# Altium schematic symbol library Capacitor - Ceramic - Sumsung.SchLib: 1421 symbols (part 6 of 8) (continued)
## CL31B105KBHNFNE (continued)
CAP CER 1UF 50V X7R 1206; Part Number: CL31B105KBHNFNE; Manufacturer: Samsung Electro-Mechanics America, Inc.; TemperatureRange: -55C ~ 125C; Tolerance: 10%; Value: 1uF; PartId: 17699; Supplier 1: Digi-Key; Supplier Part Number 1: 1276-3091-2-ND; ComponentLink1Description: Datasheet; ComponentLink1URL: http://www.samsungsem.com/kr/support/product-search/mlcc/__icsFiles/afieldfile/2016/08/18/S_CL31B105KBHNFNE.pdf; ComponentLink2Description: Digi-Key Listing; ComponentLink2URL: https://www.digikey.com/product-detail/en/samsung-electro-mechanics-america-inc/CL31B105KBHNFNE/1276-3091-2-ND/3888749; TemperatureCoefficient: X7R; Voltage: 50V; Price: 0.0513; Device Package: 1206 (3216 Metric)
footprint CAP 1206/3216 - 1.8MM
pins: 1, 2

## CL31B105KBHNNNE
designator C?, comment 1uF
CAP CER 1UF 50V X7R 1206; Part Number: CL31B105KBHNNNE; Manufacturer: Samsung Electro-Mechanics America, Inc.; TemperatureRange: -55C ~ 125C; Tolerance: 10%; Value: 1uF; PartId: 6164; Supplier 1: Digi-Key; Supplier Part Number 1: 1276-1068-2-ND; ComponentLink1Description: Datasheet; ComponentLink1URL: http://www.samsungsem.com/kr/support/product-search/mlcc/CL31B105KBHNNNE.jsp; ComponentLink2Description: Digi-Key listing; ComponentLink2URL: http://digikey.com/product-detail/en/CL31B105KBHNNNE/1276-1068-2-ND/3886726; TemperatureCoefficient: X7R; Voltage: 50V; Price: 0.0489; Type: -; Device Package: 1206 (3216 Metric)
footprint CAP 1206/3216
pins: 1, 2

## CL31B105KBHWPNE
designator C?, comment 1uF
CAP CER 1UF 50V X7R 1206; Part Number: CL31B105KBHWPNE; Manufacturer: Samsung Electro-Mechanics America, Inc.; TemperatureRange: -55C ~ 125C; Tolerance: 10%; Value: 1uF; PartId: 17749; Supplier 1: Digi-Key; Supplier Part Number 1: 1276-6737-2-ND; ComponentLink1Description: Datasheet; ComponentLink1URL: //media.digikey.com/pdf/Data%20Sheets/Samsung%20PDFs/MLCC_Catalog_2015.pdf; ComponentLink2Description: Digi-Key Listing; ComponentLink2URL: https://www.digikey.com/product-detail/en/samsung-electro-mechanics-america-inc/CL31B105KBHWPNE/1276-6737-2-ND/5961221; TemperatureCoefficient: X7R; Voltage: 50V; Price: 0.1068; Device Package: 1206 (3216 Metric)
footprint CAP 1206/3216 - 1.8MM
pins: 1, 2

## CL31B105KCHNFNE
designator C?, comment 1uF
CAP CER 1UF 100V X7R 1206; Part Number: CL31B105KCHNFNE; Manufacturer: Samsung Electro-Mechanics America, Inc.; TemperatureRange: -55C ~ 125C; Tolerance: 10%; Value: 1uF; PartId: 17949; Supplier 1: Digi-Key; Supplier Part Number 1: 1276-3094-2-ND; ComponentLink1Description: Datasheet; ComponentLink1URL: //media.digikey.com/pdf/Data%20Sheets/Samsung%20PDFs/CL31B105KCHNFNE_Spec.pdf; ComponentLink2Description: Digi-Key Listing; ComponentLink2URL: https://www.digikey.com/product-detail/en/samsung-electro-mechanics-america-inc/CL31B105KCHNFNE/1276-3094-2-ND/3888752; TemperatureCoefficient: X7R; Voltage: 100V; Price: 0.1218; Device Package: 1206 (3216 Metric)
footprint CAP 1206/3216 - 1.8MM
pins: 1, 2

## CL31B105KCHNNNE
designator C?, comment 1uF
CAP CER 1UF 100V X7R 1206; Part Number: CL31B105KCHNNNE; Manufacturer: Samsung Electro-Mechanics America, Inc.; TemperatureRange: -55C ~ 125C; Tolerance: 10%; Value: 1uF; PartId: 6198; Supplier 1: Digi-Key; Supplier Part Number 1: 1276-1838-2-ND; ComponentLink1Description: Datasheet; ComponentLink1URL: http://www.samsungsem.com/kr/support/product-search/mlcc/CL31B105KCHNNNE.jsp; ComponentLink2Description: Digi-Key listing; ComponentLink2URL: http://digikey.com/product-detail/en/CL31B105KCHNNNE/1276-1838-2-ND/3887496; TemperatureCoefficient: X7R; Voltage: 100V; Price: 0.1037; Type: -; Device Package: 1206 (3216 Metric)
footprint CAP 1206/3216
pins: 1, 2

## CL31B105KCHSNNE
designator C?, comment 1uF
CAP CER 1UF 100V X7R 1206; Part Number: CL31B105KCHSNNE; Manufacturer: Samsung Electro-Mechanics America, Inc.; TemperatureRange: -55C ~ 125C; Tolerance: 10%; Value: 1uF; PartId: 17470; Supplier 1: Digi-Key; Supplier Part Number 1: 1276-2747-2-ND; ComponentLink1Description: Datasheet; ComponentLink1URL: //media.digikey.com/pdf/Data%20Sheets/Samsung%20PDFs/CL31B105KCHSNNE_Spec.pdf; ComponentLink2Description: Digi-Key Listing; ComponentLink2URL: https://www.digikey.com/product-detail/en/samsung-electro-mechanics-america-inc/CL31B105KCHSNNE/1276-2747-2-ND/3888405; TemperatureCoefficient: X7R; Voltage: 100V; Price: 0.1218; Device Package: 1206 (3216 Metric)
footprint CAP 1206/3216 - 1.8MM
pins: 1, 2

## CL31B105KOFNNNE
designator C?, comment 1uF
CAP CER 1UF 16V X7R 1206; Part Number: CL31B105KOFNNNE; Manufacturer: Samsung Electro-Mechanics America, Inc.; TemperatureRange: -55C ~ 125C; Tolerance: 10%; Value: 1uF; PartId: 6162; Supplier 1: Digi-Key; Supplier Part Number 1: 1276-1783-2-ND; ComponentLink1Description: Datasheet; ComponentLink1URL: http://www.samsungsem.com/kr/support/product-search/mlcc/CL31B105KOFNNNE.jsp; ComponentLink2Description: Digi-Key listing; ComponentLink2URL: http://digikey.com/product-detail/en/CL31B105KOFNNNE/1276-1783-2-ND/3887441; TemperatureCoefficient: X7R; Voltage: 16V; Price: 0.038; Type: -; Device Package: 1206 (3216 Metric)
footprint CAP 1206/3216
pins: 1, 2

## CL31B105MAHNNNE
designator C?, comment 1uF
CAP CER 1UF 25V X7R 1206; Part Number: CL31B105MAHNNNE; Manufacturer: Samsung Electro-Mechanics America, Inc.; TemperatureRange: -55C ~ 125C; Tolerance: 20%; Value: 1uF; PartId: 17578; Supplier 1: Digi-Key; Supplier Part Number 1: 1276-3098-2-ND; ComponentLink1Description: Datasheet; ComponentLink1URL: http://www.samsungsem.com/kr/support/product-search/mlcc/__icsFiles/afieldfile/2016/08/18/S_CL31B105MAHNNNE.pdf; ComponentLink2Description: Digi-Key Listing; ComponentLink2URL: https://www.digikey.com/product-detail/en/samsung-electro-mechanics-america-inc/CL31B105MAHNNNE/1276-3098-2-ND/3888756; TemperatureCoefficient: X7R; Voltage: 25V; Price: 0.0396; Device Package: 1206 (3216 Metric)
footprint CAP 1206/3216 - 1.8MM
pins: 1, 2

## CL31B106KAHNFNE
designator C?, comment 10uF
CAP CER 10UF 25V X7R 1206; Part Number: CL31B106KAHNFNE; Manufacturer: Samsung Electro-Mechanics America, Inc.; TemperatureRange: -55C ~ 125C; Tolerance: 10%; Value: 10uF; PartId: 15883; Supplier 1: Digi-Key; Supplier Part Number 1: 1276-3100-2-ND; ComponentLink1Description: Datasheet; ComponentLink1URL: http://www.samsungsem.com/kr/support/product-search/mlcc/CL31B106KAHNFNE.jsp; ComponentLink2Description: Digi-Key Listing; ComponentLink2URL: https://www.digikey.com/product-detail/en/samsung-electro-mechanics-america-inc/CL31B106KAHNFNE/1276-3100-2-ND/3888758; TemperatureCoefficient: X7R; Voltage: 25V; Price: 0.0976; Device Package: 1206 (3216 Metric)
footprint CAP 1206/3216
pins: 1, 2

## CL31B106KAHNNNE
designator C?, comment 10uF
CAP CER 10UF 25V X7R 1206; Part Number: CL31B106KAHNNNE; Manufacturer: Samsung Electro-Mechanics America, Inc.; TemperatureRange: -55C ~ 125C; Tolerance: 10%; Value: 10uF; PartId: 15760; Supplier 1: Digi-Key; Supplier Part Number 1: 1276-1804-2-ND; ComponentLink1Description: Datasheet; ComponentLink1URL: http://www.samsungsem.com/kr/support/product-search/mlcc/CL31B106KAHNNNE.jsp; ComponentLink2Description: Digi-Key Listing; ComponentLink2URL: https://www.digikey.com/product-detail/en/samsung-electro-mechanics-america-inc/CL31B106KAHNNNE/1276-1804-2-ND/3887462; TemperatureCoefficient: X7R; Voltage: 25V; Price: 0.0976; Device Package: 1206 (3216 Metric)
footprint CAP 1206/3216
pins: 1, 2

## CL31B106KAHSFNE
designator C?, comment 10uF
CAP CER 10UF 25V X7R 1206; Part Number: CL31B106KAHSFNE; Manufacturer: Samsung Electro-Mechanics America, Inc.; TemperatureRange: -55C ~ 125C; Tolerance: 10%; Value: 10uF; PartId: 17742; Supplier 1: Digi-Key; Supplier Part Number 1: 1276-3101-2-ND; ComponentLink1Description: Datasheet; ComponentLink1URL: http://www.samsungsem.com/kr/support/product-search/mlcc/__icsFiles/afieldfile/2016/08/18/S_CL31B106KAHSFNE.pdf; ComponentLink2Description: Digi-Key Listing; ComponentLink2URL: https://www.digikey.com/product-detail/en/samsung-electro-mechanics-america-inc/CL31B106KAHSFNE/1276-3101-2-ND/3888759; TemperatureCoefficient: X7R; Voltage: 25V; Price: 0.1205; Device Package: 1206 (3216 Metric)
footprint CAP 1206/3216 - 1.8MM
pins: 1, 2

## CL31B106KLHNFNE
designator C?, comment 10uF
CAP CER 10UF 35V X7R 1206; Part Number: CL31B106KLHNFNE; Manufacturer: Samsung Electro-Mechanics America, Inc.; TemperatureRange: -55C ~ 125C; Tolerance: 10%; Value: 10uF; PartId: 16006; Supplier 1: Digi-Key; Supplier Part Number 1: 1276-3102-2-ND; ComponentLink1Description: Datasheet; ComponentLink1URL: http://www.samsungsem.com/kr/support/product-search/mlcc/CL31B106KLHNFNE.jsp; ComponentLink2Description: Digi-Key Listing; ComponentLink2URL: https://www.digikey.com/product-detail/en/samsung-electro-mechanics-america-inc/CL31B106KLHNFNE/1276-3102-2-ND/3888760; TemperatureCoefficient: X7R; Voltage: 35V; Price: 0.3179; Device Package: 1206 (3216 Metric)
footprint CAP 1206/3216
pins: 1, 2

## CL31B106KLHNNNE
designator C?, comment 10uF
CAP CER 10UF 35V X7R 1206; Part Number: CL31B106KLHNNNE; Manufacturer: Samsung Electro-Mechanics America, Inc.; TemperatureRange: -55C ~ 125C; Tolerance: 10%; Value: 10uF; PartId: 15817; Supplier 1: Digi-Key; Supplier Part Number 1: 1276-3103-2-ND; ComponentLink1Description: Datasheet; ComponentLink1URL: http://www.samsungsem.com/kr/support/product-search/mlcc/CL31B106KLHNNNE.jsp; ComponentLink2Description: Digi-Key Listing; ComponentLink2URL: https://www.digikey.com/product-detail/en/samsung-electro-mechanics-america-inc/CL31B106KLHNNNE/1276-3103-2-ND/3888761; TemperatureCoefficient: X7R; Voltage: 35V; Price: 0.2759; Device Package: 1206 (3216 Metric)
footprint CAP 1206/3216
pins: 1, 2

## CL31B106KOHNFNE
designator C?, comment 10uF
CAP CER 10UF 16V X7R 1206; Part Number: CL31B106KOHNFNE; Manufacturer: Samsung Electro-Mechanics America, Inc.; TemperatureRange: -55C ~ 125C; Tolerance: 10%; Value: 10uF; PartId: 15962; Supplier 1: Digi-Key; Supplier Part Number 1: 1276-3104-2-ND; ComponentLink1Description: Datasheet; ComponentLink1URL: http://www.samsungsem.com/kr/support/product-search/mlcc/CL31B106KOHNFNE.jsp; ComponentLink2Description: Digi-Key Listing; ComponentLink2URL: https://www.digikey.com/product-detail/en/samsung-electro-mechanics-america-inc/CL31B106KOHNFNE/1276-3104-2-ND/3888762; TemperatureCoefficient: X7R; Voltage: 16V; Price: 0.094; Device Package: 1206 (3216 Metric)
footprint CAP 1206/3216
pins: 1, 2

## CL31B106KOHNNNE
designator C?, comment 10uF
CAP CER 10UF 16V X7R 1206; Part Number: CL31B106KOHNNNE; Manufacturer: Samsung Electro-Mechanics America, Inc.; TemperatureRange: -55C ~ 125C; Tolerance: 10%; Value: 10uF; PartId: 15879; Supplier 1: Digi-Key; Supplier Part Number 1: 1276-1082-2-ND; ComponentLink1Description: Datasheet; ComponentLink1URL: http://www.samsungsem.com/kr/support/product-search/mlcc/CL31B106KOHNNNE.jsp; ComponentLink2Description: Digi-Key Listing; ComponentLink2URL: https://www.digikey.com/product-detail/en/samsung-electro-mechanics-america-inc/CL31B106KOHNNNE/1276-1082-2-ND/3886740; TemperatureCoefficient: X7R; Voltage: 16V; Price: 0.094; Device Package: 1206 (3216 Metric)
footprint CAP 1206/3216
pins: 1, 2

## CL31B106KOHNNWE
designator C?, comment 10uF
CAP CER 10UF 16V X7R 1206; Part Number: CL31B106KOHNNWE; Manufacturer: Samsung Electro-Mechanics America, Inc.; TemperatureRange: -55C ~ 125C; Tolerance: 10%; Value: 10uF; PartId: 17430; Supplier 1: Digi-Key; Supplier Part Number 1: 1276-3105-2-ND; ComponentLink1Description: Datasheet; ComponentLink1URL: http://www.samsungsem.com/kr/support/product-search/mlcc/__icsFiles/afieldfile/2016/08/18/S_CL31B106KOHNNWE.pdf; ComponentLink2Description: Digi-Key Listing; ComponentLink2URL: https://www.digikey.com/product-detail/en/samsung-electro-mechanics-america-inc/CL31B106KOHNNWE/1276-3105-2-ND/3888763; TemperatureCoefficient: X7R; Voltage: 16V; Price: 0.1014; Device Package: 1206 (3216 Metric)
footprint CAP 1206/3216 - 1.8MM
pins: 1, 2

## CL31B106KOHVPNE
designator C?, comment 10uF
CAP CER 10UF 16V X7R 1206; Part Number: CL31B106KOHVPNE; Manufacturer: Samsung Electro-Mechanics America, Inc.; TemperatureRange: -55C ~ 125C; Tolerance: 10%; Value: 10uF; PartId: 17722; Supplier 1: Digi-Key; Supplier Part Number 1: 1276-6797-2-ND; ComponentLink1Description: Datasheet; ComponentLink1URL: //media.digikey.com/pdf/Data%20Sheets/Samsung%20PDFs/MLCC_Catalog_2015.pdf; ComponentLink2Description: Digi-Key Listing; ComponentLink2URL: https://www.digikey.com/product-detail/en/samsung-electro-mechanics-america-inc/CL31B106KOHVPNE/1276-6797-2-ND/5961281; TemperatureCoefficient: X7R; Voltage: 16V; Price: 0.1638; Device Package: 1206 (3216 Metric)
footprint CAP 1206/3216 - 1.8MM
pins: 1, 2

## CL31B106KPHN3NE
designator C?, comment 10uF
CAP CER 10UF 10V X7R 1206; Part Number: CL31B106KPHN3NE; Manufacturer: Samsung Electro-Mechanics America, Inc.; TemperatureRange: -55C ~ 125C; Tolerance: 10%; Value: 10uF; PartId: 15956; Supplier 1: Digi-Key; Supplier Part Number 1: 1276-3106-2-ND; ComponentLink1Description: Datasheet; ComponentLink1URL: //media.digikey.com/pdf/Data%20Sheets/Samsung%20PDFs/CL31B106KPHN3NE_Spec.pdf; ComponentLink2Description: Digi-Key Listing; ComponentLink2URL: https://www.digikey.com/product-detail/en/samsung-electro-mechanics-america-inc/CL31B106KPHN3NE/1276-3106-2-ND/3888764; TemperatureCoefficient: X7R; Voltage: 10V; Price: 0.0736; Device Package: 1206 (3216 Metric)
footprint CAP 1206/3216
pins: 1, 2

## CL31B106KPHNNNE
designator C?, comment 10uF
CAP CER 10UF 10V X7R 1206; Part Number: CL31B106KPHNNNE; Manufacturer: Samsung Electro-Mechanics America, Inc.; TemperatureRange: -55C ~ 125C; Tolerance: 10%; Value: 10uF; PartId: 15868; Supplier 1: Digi-Key; Supplier Part Number 1: 1276-1311-2-ND; ComponentLink1Description: Datasheet; ComponentLink1URL: http://www.samsungsem.com/kr/front/downloadcms.do?path=/kr/support/product-search/mlcc/__icsFiles/afieldfile/2014/11/05&fileName=C_CL31B106KPHNNNE.pdf; ComponentLink2Description: Digi-Key Listing; ComponentLink2URL: https://www.digikey.com/product-detail/en/samsung-electro-mechanics-america-inc/CL31B106KPHNNNE/1276-1311-2-ND/3886969; TemperatureCoefficient: X7R; Voltage: 10V; Price: 0.0736; Device Package: 1206 (3216 Metric)
footprint CAP 1206/3216
pins: 1, 2

## CL31B106KPHVPNE
designator C?, comment 10uF
CAP CER 10UF 10V X7R 1206; Part Number: CL31B106KPHVPNE; Manufacturer: Samsung Electro-Mechanics America, Inc.; TemperatureRange: -55C ~ 125C; Tolerance: 10%; Value: 10uF; PartId: 17509; Supplier 1: Digi-Key; Supplier Part Number 1: 1276-6792-2-ND; ComponentLink1Description: Datasheet; ComponentLink1URL: //media.digikey.com/pdf/Data%20Sheets/Samsung%20PDFs/MLCC_Catalog_2015.pdf; ComponentLink2Description: Digi-Key Listing; ComponentLink2URL: https://www.digikey.com/product-detail/en/samsung-electro-mechanics-america-inc/CL31B106KPHVPNE/1276-6792-2-ND/5961276; TemperatureCoefficient: X7R; Voltage: 10V; Price: 0.0908; Device Package: 1206 (3216 Metric)
footprint CAP 1206/3216 - 1.8MM
pins: 1, 2

## CL31B106KQHNNNE
designator C?, comment 10uF
CAP CER 10UF 6.3V X7R 1206; Part Number: CL31B106KQHNNNE; Manufacturer: Samsung Electro-Mechanics America, Inc.; TemperatureRange: -55C ~ 125C; Tolerance: 10%; Value: 10uF; PartId: 6181; Supplier 1: Digi-Key; Supplier Part Number 1: 1276-2748-2-ND; ComponentLink1Description: Datasheet; ComponentLink1URL: http://media.digikey.com/pdf/Data%20Sheets/Samsung%20PDFs/CL31B106KQHNNNE_Spec.pdf; ComponentLink2Description: Digi-Key listing; ComponentLink2URL: http://digikey.com/product-detail/en/CL31B106KQHNNNE/1276-2748-2-ND/3888406; TemperatureCoefficient: X7R; Voltage: 6.3V; Price: 0.0757; Type: -; Device Package: 1206 (3216 Metric)
footprint CAP 1206/3216
pins: 1, 2

## CL31B106MQHNNNE
designator C?, comment 10uF
CAP CER 10UF 6.3V X7R 1206; Part Number: CL31B106MQHNNNE; Manufacturer: Samsung Electro-Mechanics America, Inc.; TemperatureRange: -55C ~ 125C; Tolerance: 20%; Value: 10uF; PartId: 6182; Supplier 1: Digi-Key; Supplier Part Number 1: 1276-3108-2-ND; ComponentLink1Description: Datasheet; ComponentLink1URL: http://media.digikey.com/pdf/Data%20Sheets/Samsung%20PDFs/CL31B106MQHNNNE_Spec.pdf; ComponentLink2Description: Digi-Key listing; ComponentLink2URL: http://digikey.com/product-detail/en/CL31B106MQHNNNE/1276-3108-2-ND/3888766; TemperatureCoefficient: X7R; Voltage: 6.3V; Price: 0.0757; Type: -; Device Package: 1206 (3216 Metric)
footprint CAP 1206/3216
pins: 1, 2

## CL31B125KPCNNNC
designator C?, comment 1.2uF
CAP CER 1.2UF 10V X7R 1206; Part Number: CL31B125KPCNNNC; Manufacturer: Samsung Electro-Mechanics America, Inc.; TemperatureRange: -55C ~ 125C; Tolerance: 10%; Value: 1.2uF; PartId: 6183; Supplier 1: Digi-Key; Supplier Part Number 1: 1276-2752-2-ND; ComponentLink1Description: Datasheet; ComponentLink1URL: http://www.samsungsem.com/kr/support/product-search/mlcc/CL31B125KPCNNNC.jsp; ComponentLink2Description: Digi-Key listing; ComponentLink2URL: http://digikey.com/product-detail/en/CL31B125KPCNNNC/1276-2752-2-ND/3888410; TemperatureCoefficient: X7R; Voltage: 10V; Price: 0.0849; Type: -; Device Package: 1206 (3216 Metric)
footprint CAP 1206/3216
pins: 1, 2

## CL31B152KHFNFNE
designator C?, comment 1500pF
CAP CER 1500PF 630V X7R 1206; Part Number: CL31B152KHFNFNE; Manufacturer: Samsung Electro-Mechanics America, Inc.; TemperatureRange: -55C ~ 125C; Tolerance: 10%; Value: 1500pF; PartId: 15511; Supplier 1: Digi-Key; Supplier Part Number 1: 1276-3110-2-ND; ComponentLink1Description: Datasheet; ComponentLink1URL: http://www.samsungsem.com/kr/support/library/product-catalog/__icsFiles/afieldfile/2015/11/18/MLCC.pdf; ComponentLink2Description: Digi-Key Listing; ComponentLink2URL: https://www.digikey.com/product-detail/en/samsung-electro-mechanics-america-inc/CL31B152KHFNFNE/1276-3110-2-ND/3888768; TemperatureCoefficient: X7R; Voltage: 630V; Price: 0.0379; Device Package: 1206 (3216 Metric)
footprint CAP 1206/3216
pins: 1, 2

## CL31B153JBCNNNC
designator C?, comment 0.015uF
CAP CER 0.015UF 50V X7R 1206; Part Number: CL31B153JBCNNNC; Manufacturer: Samsung Electro-Mechanics America, Inc.; TemperatureRange: -55C ~ 125C; Tolerance: 5%; Value: 0.015uF; PartId: 17273; Supplier 1: Digi-Key; Supplier Part Number 1: 1276-2754-2-ND; ComponentLink1Description: Datasheet; ComponentLink1URL: http://www.samsungsem.com/kr/support/product-search/mlcc/__icsFiles/afieldfile/2016/08/18/S_CL31B153JBCNNNC.pdf; ComponentLink2Description: Digi-Key Listing; ComponentLink2URL: https://www.digikey.com/product-detail/en/samsung-electro-mechanics-america-inc/CL31B153JBCNNNC/1276-2754-2-ND/3888412; TemperatureCoefficient: X7R; Voltage: 50V; Price: 0.0198; Device Package: 1206 (3216 Metric)
footprint CAP 1206/3216 - 1.0MM
pins: 1, 2

## CL31B153KBCNNNC
designator C?, comment 0.015uF
CAP CER 0.015UF 50V X7R 1206; Part Number: CL31B153KBCNNNC; Manufacturer: Samsung Electro-Mechanics America, Inc.; TemperatureRange: -55C ~ 125C; Tolerance: 10%; Value: 0.015uF; PartId: 17159; Supplier 1: Digi-Key; Supplier Part Number 1: 1276-1773-2-ND; ComponentLink1Description: Datasheet; ComponentLink1URL: http://www.samsungsem.com/kr/support/product-search/mlcc/__icsFiles/afieldfile/2016/08/18/S_CL31B153KBCNNNC.pdf; ComponentLink2Description: Digi-Key Listing; ComponentLink2URL: https://www.digikey.com/product-detail/en/samsung-electro-mechanics-america-inc/CL31B153KBCNNNC/1276-1773-2-ND/3887431; TemperatureCoefficient: X7R; Voltage: 50V; Price: 0.0325; Device Package: 1206 (3216 Metric)
footprint CAP 1206/3216 - 1.0MM
pins: 1, 2

## CL31B153KCCNNNC
designator C?, comment 0.015uF
CAP CER 0.015UF 100V X7R 1206; Part Number: CL31B153KCCNNNC; Manufacturer: Samsung Electro-Mechanics America, Inc.; TemperatureRange: -55C ~ 125C; Tolerance: 10%; Value: 0.015uF; PartId: 17275; Supplier 1: Digi-Key; Supplier Part Number 1: 1276-2755-2-ND; ComponentLink1Description: Datasheet; ComponentLink1URL: http://www.samsungsem.com/kr/support/product-search/mlcc/__icsFiles/afieldfile/2016/08/18/S_CL31B153KCCNNNC.pdf; ComponentLink2Description: Digi-Key Listing; ComponentLink2URL: https://www.digikey.com/product-detail/en/samsung-electro-mechanics-america-inc/CL31B153KCCNNNC/1276-2755-2-ND/3888413; TemperatureCoefficient: X7R; Voltage: 100V; Price: 0.0279; Device Package: 1206 (3216 Metric)
footprint CAP 1206/3216 - 1.0MM
pins: 1, 2

## CL31B153KHFSFNE
designator C?, comment 0.015uF
CAP CER 0.015UF 630V X7R 1206; Part Number: CL31B153KHFSFNE; Manufacturer: Samsung Electro-Mechanics America, Inc.; TemperatureRange: -55C ~ 125C; Tolerance: 10%; Value: 0.015uF; PartId: 15499; Supplier 1: Digi-Key; Supplier Part Number 1: 1276-3112-2-ND; ComponentLink1Description: Datasheet; ComponentLink1URL: http://www.samsungsem.com/kr/support/library/product-catalog/__icsFiles/afieldfile/2015/11/18/MLCC.pdf; ComponentLink2Description: Digi-Key Listing; ComponentLink2URL: https://www.digikey.com/product-detail/en/samsung-electro-mechanics-america-inc/CL31B153KHFSFNE/1276-3112-2-ND/3888770; TemperatureCoefficient: X7R; Voltage: 630V; Price: 0.076; Device Package: 1206 (3216 Metric)
footprint CAP 1206/3216
pins: 1, 2

## CL31B154KBCNNWC
designator C?, comment 0.15uF
CAP CER 0.15UF 50V X7R 1206; Part Number: CL31B154KBCNNWC; Manufacturer: Samsung Electro-Mechanics America, Inc.; TemperatureRange: -55C ~ 125C; Tolerance: 10%; Value: 0.15uF; PartId: 17272; Supplier 1: Digi-Key; Supplier Part Number 1: 1276-2758-2-ND; ComponentLink1Description: Datasheet; ComponentLink1URL: http://www.samsungsem.com/kr/support/product-search/mlcc/__icsFiles/afieldfile/2016/08/18/S_CL31B154KBCNNWC.pdf; ComponentLink2Description: Digi-Key Listing; ComponentLink2URL: https://www.digikey.com/product-detail/en/samsung-electro-mechanics-america-inc/CL31B154KBCNNWC/1276-2758-2-ND/3888416; TemperatureCoefficient: X7R; Voltage: 50V; Price: 0.0235; Device Package: 1206 (3216 Metric)
footprint CAP 1206/3216 - 1.0MM
pins: 1, 2

## CL31B154KBPWPNE
designator C?, comment 0.15uF
CAP CER 0.15UF 50V X7R 1206; Part Number: CL31B154KBPWPNE; Manufacturer: Samsung Electro-Mechanics America, Inc.; TemperatureRange: -55C ~ 125C; Tolerance: 10%; Value: 0.15uF; PartId: 17761; Supplier 1: Digi-Key; Supplier Part Number 1: 1276-6676-2-ND; ComponentLink1Description: Datasheet; ComponentLink1URL: //media.digikey.com/pdf/Data%20Sheets/Samsung%20PDFs/MLCC_Catalog_2015.pdf; ComponentLink2Description: Digi-Key Listing; ComponentLink2URL: https://www.digikey.com/product-detail/en/samsung-electro-mechanics-america-inc/CL31B154KBPWPNE/1276-6676-2-ND/5961160; TemperatureCoefficient: X7R; Voltage: 50V; Price: 0.0662; Device Package: 1206 (3216 Metric)
footprint CAP 1206/3216 - 1.8MM
pins: 1, 2

## CL31B154KCHNNNE
designator C?, comment 0.15uF
CAP CER 0.15UF 100V X7R 1206; Part Number: CL31B154KCHNNNE; Manufacturer: Samsung Electro-Mechanics America, Inc.; TemperatureRange: -55C ~ 125C; Tolerance: 10%; Value: 0.15uF; PartId: 17964; Supplier 1: Digi-Key; Supplier Part Number 1: 1276-3114-2-ND; ComponentLink1Description: Datasheet; ComponentLink1URL: //media.digikey.com/pdf/Data%20Sheets/Samsung%20PDFs/CL31B154KCHNNNE_Character.pdf; ComponentLink2Description: Digi-Key Listing; ComponentLink2URL: https://www.digikey.com/product-detail/en/samsung-electro-mechanics-america-inc/CL31B154KCHNNNE/1276-3114-2-ND/3888772; TemperatureCoefficient: X7R; Voltage: 100V; Price: 0.0902; Device Package: 1206 (3216 Metric)
footprint CAP 1206/3216 - 1.8MM
pins: 1, 2

## CL31B155KAHVPNE
designator C?, comment 1.5uF
CAP CER 1.5UF 25V X7R 1206; Part Number: CL31B155KAHVPNE; Manufacturer: Samsung Electro-Mechanics America, Inc.; TemperatureRange: -55C ~ 125C; Tolerance: 10%; Value: 1.5uF; PartId: 17583; Supplier 1: Digi-Key; Supplier Part Number 1: 1276-6873-2-ND; ComponentLink1Description: Datasheet; ComponentLink1URL: //media.digikey.com/pdf/Data%20Sheets/Samsung%20PDFs/MLCC_Catalog_2015.pdf; ComponentLink2Description: Digi-Key Listing; ComponentLink2URL: https://www.digikey.com/product-detail/en/samsung-electro-mechanics-america-inc/CL31B155KAHVPNE/1276-6873-2-ND/5961357; TemperatureCoefficient: X7R; Voltage: 25V; Price: 0.0851; Device Package: 1206 (3216 Metric)
footprint CAP 1206/3216 - 1.8MM
pins: 1, 2

## CL31B155KBHVPNE
designator C?, comment 1.5uF
CAP CER 1.5UF 50V X7R 1206; Part Number: CL31B155KBHVPNE; Manufacturer: Samsung Electro-Mechanics America, Inc.; TemperatureRange: -55C ~ 125C; Tolerance: 10%; Value: 1.5uF; PartId: 17748; Supplier 1: Digi-Key; Supplier Part Number 1: 1276-6738-2-ND; ComponentLink1Description: Datasheet; ComponentLink1URL: //media.digikey.com/pdf/Data%20Sheets/Samsung%20PDFs/MLCC_Catalog_2015.pdf; ComponentLink2Description: Digi-Key Listing; ComponentLink2URL: https://www.digikey.com/product-detail/en/samsung-electro-mechanics-america-inc/CL31B155KBHVPNE/1276-6738-2-ND/5961222; TemperatureCoefficient: X7R; Voltage: 50V; Price: 0.1068; Device Package: 1206 (3216 Metric)
footprint CAP 1206/3216 - 1.8MM
pins: 1, 2

## CL31B155KOFNNNE
designator C?, comment 1.5uF
CAP CER 1.5UF 16V X7R 1206; Part Number: CL31B155KOFNNNE; Manufacturer: Samsung Electro-Mechanics America, Inc.; TemperatureRange: -55C ~ 125C; Tolerance: 10%; Value: 1.5uF; PartId: 6185; Supplier 1: Digi-Key; Supplier Part Number 1: 1276-3115-2-ND; ComponentLink1Description: Datasheet; ComponentLink1URL: http://media.digikey.com/pdf/Data%20Sheets/Samsung%20PDFs/CL31B155KOFNNNE_Character.pdf; ComponentLink2Description: Digi-Key listing; ComponentLink2URL: http://digikey.com/product-detail/en/CL31B155KOFNNNE/1276-3115-2-ND/3888773; TemperatureCoefficient: X7R; Voltage: 16V; Price: 0.0886; Type: -; Device Package: 1206 (3216 Metric)
footprint CAP 1206/3216
pins: 1, 2

## CL31B221KGFNNNE
designator C?, comment 220pF
CAP CER 220PF 500V X7R 1206; Part Number: CL31B221KGFNNNE; Manufacturer: Samsung Electro-Mechanics America, Inc.; TemperatureRange: -55C ~ 125C; Tolerance: 10%; Value: 220pF; PartId: 15488; Supplier 1: Digi-Key; Supplier Part Number 1: 1276-3116-2-ND; ComponentLink1Description: Datasheet; ComponentLink1URL: //media.digikey.com/pdf/Data%20Sheets/Samsung%20PDFs/CL31B221KGFNNNE_Spec.pdf; ComponentLink2Description: Digi-Key Listing; ComponentLink2URL: https://www.digikey.com/product-detail/en/samsung-electro-mechanics-america-inc/CL31B221KGFNNNE/1276-3116-2-ND/3888774; TemperatureCoefficient: X7R; Voltage: 500V; Price: 0.1119; Device Package: 1206 (3216 Metric)
footprint CAP 1206/3216
pins: 1, 2

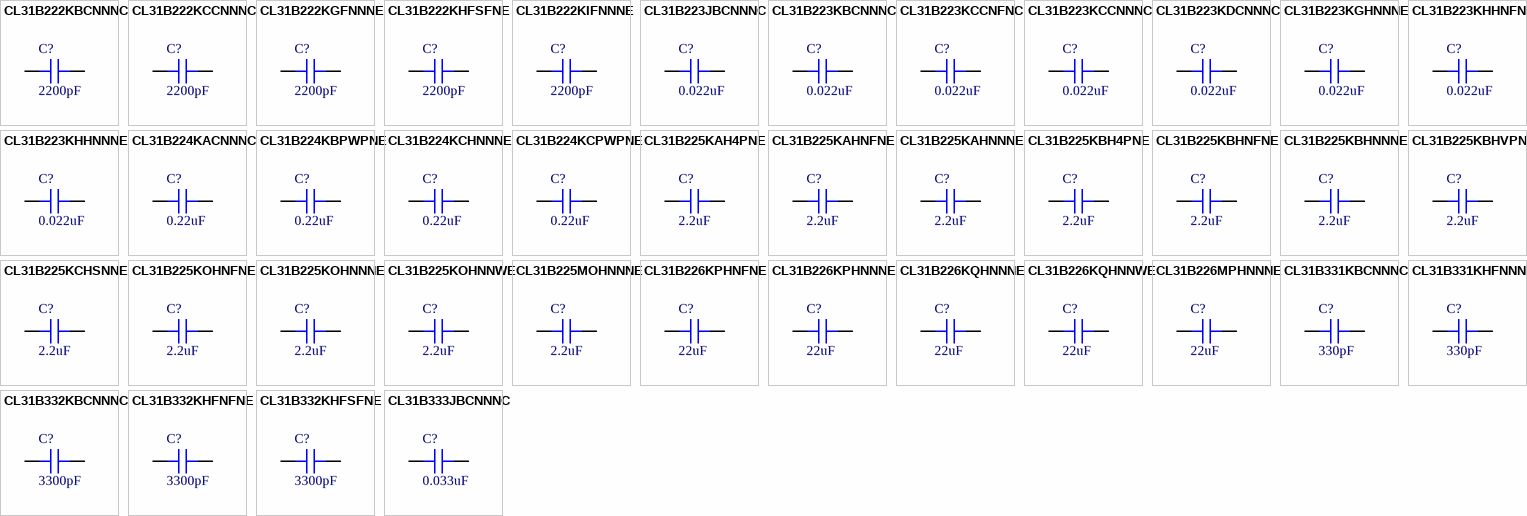
[diagram p27: symbols CL31B222KBCNNNC to CL31B333JBCNNNC]

## CL31B222KBCNNNC
designator C?, comment 2200pF
CAP CER 2200PF 50V X7R 1206; Part Number: CL31B222KBCNNNC; Manufacturer: Samsung Electro-Mechanics America, Inc.; TemperatureRange: -55C ~ 125C; Tolerance: 10%; Value: 2200pF; PartId: 17171; Supplier 1: Digi-Key; Supplier Part Number 1: 1276-1288-2-ND; ComponentLink1Description: Datasheet; ComponentLink1URL: http://www.samsungsem.com/kr/support/product-search/mlcc/__icsFiles/afieldfile/2016/08/18/S_CL31B222KBCNNNC.pdf; ComponentLink2Description: Digi-Key Listing; ComponentLink2URL: https://www.digikey.com/product-detail/en/samsung-electro-mechanics-america-inc/CL31B222KBCNNNC/1276-1288-2-ND/3886946; TemperatureCoefficient: X7R; Voltage: 50V; Price: 0.0325; Device Package: 1206 (3216 Metric)
footprint CAP 1206/3216 - 1.0MM
pins: 1, 2

## CL31B222KCCNNNC
designator C?, comment 2200pF
CAP CER 2200PF 100V X7R 1206; Part Number: CL31B222KCCNNNC; Manufacturer: Samsung Electro-Mechanics America, Inc.; TemperatureRange: -55C ~ 125C; Tolerance: 10%; Value: 2200pF; PartId: 17283; Supplier 1: Digi-Key; Supplier Part Number 1: 1276-2760-2-ND; ComponentLink1Description: Datasheet; ComponentLink1URL: //media.digikey.com/pdf/Data%20Sheets/Samsung%20PDFs/CL31B222KCCNNNC_Spec.pdf; ComponentLink2Description: Digi-Key Listing; ComponentLink2URL: https://www.digikey.com/product-detail/en/samsung-electro-mechanics-america-inc/CL31B222KCCNNNC/1276-2760-2-ND/3888418; TemperatureCoefficient: X7R; Voltage: 100V; Price: 0.0441; Device Package: 1206 (3216 Metric)
footprint CAP 1206/3216 - 1.0MM
pins: 1, 2

## CL31B222KGFNNNE
designator C?, comment 2200pF
CAP CER 2200PF 500V X7R 1206; Part Number: CL31B222KGFNNNE; Manufacturer: Samsung Electro-Mechanics America, Inc.; TemperatureRange: -55C ~ 125C; Tolerance: 10%; Value: 2200pF; PartId: 15434; Supplier 1: Digi-Key; Supplier Part Number 1: 1276-3118-2-ND; ComponentLink1Description: Datasheet; ComponentLink1URL: //media.digikey.com/pdf/Data%20Sheets/Samsung%20PDFs/CL31B222KGFNNNE_Spec.pdf; ComponentLink2Description: Digi-Key Listing; ComponentLink2URL: https://www.digikey.com/product-detail/en/samsung-electro-mechanics-america-inc/CL31B222KGFNNNE/1276-3118-2-ND/3888776; TemperatureCoefficient: X7R; Voltage: 500V; Price: 0.0443; Device Package: 1206 (3216 Metric)
footprint CAP 1206/3216
pins: 1, 2

## CL31B222KHFSFNE
designator C?, comment 2200pF
CAP CER 2200PF 630V X7R 1206; Part Number: CL31B222KHFSFNE; Manufacturer: Samsung Electro-Mechanics America, Inc.; TemperatureRange: -55C ~ 125C; Tolerance: 10%; Value: 2200pF; PartId: 15475; Supplier 1: Digi-Key; Supplier Part Number 1: 1276-3121-2-ND; ComponentLink1Description: Datasheet; ComponentLink1URL: //media.digikey.com/pdf/Data%20Sheets/Samsung%20PDFs/CL31B222KHFSFNE_Character.pdf; ComponentLink2Description: Digi-Key Listing; ComponentLink2URL: https://www.digikey.com/product-detail/en/samsung-electro-mechanics-america-inc/CL31B222KHFSFNE/1276-3121-2-ND/3888779; TemperatureCoefficient: X7R; Voltage: 630V; Price: 0.0345; Device Package: 1206 (3216 Metric)
footprint CAP 1206/3216
pins: 1, 2

## CL31B222KIFNNNE
designator C?, comment 2200pF
CAP CER 2200PF 1KV X7R 1206; Part Number: CL31B222KIFNNNE; Manufacturer: Samsung Electro-Mechanics America, Inc.; TemperatureRange: -55C ~ 125C; Tolerance: 10%; Voltage: 1000V (1kV); Value: 2200pF; PartId: 15461; Supplier 1: Digi-Key; Supplier Part Number 1: 1276-3122-2-ND; ComponentLink1Description: Datasheet; ComponentLink1URL: //media.digikey.com/pdf/Data%20Sheets/Samsung%20PDFs/CL31B222KIFNNNE_Spec.pdf; ComponentLink2Description: Digi-Key Listing; ComponentLink2URL: https://www.digikey.com/product-detail/en/samsung-electro-mechanics-america-inc/CL31B222KIFNNNE/1276-3122-2-ND/3888780; TemperatureCoefficient: X7R; Price: 0.0639; Device Package: 1206 (3216 Metric)
footprint CAP 1206/3216
pins: 1, 2

## CL31B223JBCNNNC
designator C?, comment 0.022uF
CAP CER 0.022UF 50V X7R 1206; Part Number: CL31B223JBCNNNC; Manufacturer: Samsung Electro-Mechanics America, Inc.; TemperatureRange: -55C ~ 125C; Tolerance: 5%; Value: 0.022uF; PartId: 17287; Supplier 1: Digi-Key; Supplier Part Number 1: 1276-2762-2-ND; ComponentLink1Description: Datasheet; ComponentLink1URL: http://www.samsungsem.com/kr/support/product-search/mlcc/__icsFiles/afieldfile/2016/08/18/S_CL31B223JBCNNNC.pdf; ComponentLink2Description: Digi-Key Listing; ComponentLink2URL: https://www.digikey.com/product-detail/en/samsung-electro-mechanics-america-inc/CL31B223JBCNNNC/1276-2762-2-ND/3888420; TemperatureCoefficient: X7R; Voltage: 50V; Price: 0.0365; Device Package: 1206 (3216 Metric)
footprint CAP 1206/3216 - 1.0MM
pins: 1, 2

## CL31B223KBCNNNC
designator C?, comment 0.022uF
CAP CER 0.022UF 50V X7R 1206; Part Number: CL31B223KBCNNNC; Manufacturer: Samsung Electro-Mechanics America, Inc.; TemperatureRange: -55C ~ 125C; Tolerance: 10%; Value: 0.022uF; PartId: 17054; Supplier 1: Digi-Key; Supplier Part Number 1: 1276-1142-2-ND; ComponentLink1Description: Datasheet; ComponentLink1URL: http://www.samsungsem.com/kr/support/product-search/mlcc/__icsFiles/afieldfile/2016/08/18/S_CL31B223KBCNNNC.pdf; ComponentLink2Description: Digi-Key Listing; ComponentLink2URL: https://www.digikey.com/product-detail/en/samsung-electro-mechanics-america-inc/CL31B223KBCNNNC/1276-1142-2-ND/3886800; TemperatureCoefficient: X7R; Voltage: 50V; Price: 0.035; Device Package: 1206 (3216 Metric)
footprint CAP 1206/3216 - 1.0MM
pins: 1, 2

## CL31B223KCCNFNC
designator C?, comment 0.022uF
CAP CER 0.022UF 100V X7R 1206; Part Number: CL31B223KCCNFNC; Manufacturer: Samsung Electro-Mechanics America, Inc.; TemperatureRange: -55C ~ 125C; Tolerance: 10%; Value: 0.022uF; PartId: 17107; Supplier 1: Digi-Key; Supplier Part Number 1: 1276-2763-2-ND; ComponentLink1Description: Datasheet; ComponentLink1URL: //media.digikey.com/pdf/Data%20Sheets/Samsung%20PDFs/CL31B223KCCNFNC_Spec.pdf; ComponentLink2Description: Digi-Key Listing; ComponentLink2URL: https://www.digikey.com/product-detail/en/samsung-electro-mechanics-america-inc/CL31B223KCCNFNC/1276-2763-2-ND/3888421; TemperatureCoefficient: X7R; Voltage: 100V; Price: 0.0365; Device Package: 1206 (3216 Metric)
footprint CAP 1206/3216 - 1.0MM
pins: 1, 2

## CL31B223KCCNNNC
designator C?, comment 0.022uF
CAP CER 0.022UF 100V X7R 1206; Part Number: CL31B223KCCNNNC; Manufacturer: Samsung Electro-Mechanics America, Inc.; TemperatureRange: -55C ~ 125C; Tolerance: 10%; Value: 0.022uF; PartId: 17053; Supplier 1: Digi-Key; Supplier Part Number 1: 1276-2764-2-ND; ComponentLink1Description: Datasheet; ComponentLink1URL: //media.digikey.com/pdf/Data%20Sheets/Samsung%20PDFs/CL31B223KCCNNNC_Spec.pdf; ComponentLink2Description: Digi-Key Listing; ComponentLink2URL: https://www.digikey.com/product-detail/en/samsung-electro-mechanics-america-inc/CL31B223KCCNNNC/1276-2764-2-ND/3888422; TemperatureCoefficient: X7R; Voltage: 100V; Price: 0.0365; Device Package: 1206 (3216 Metric)
footprint CAP 1206/3216 - 1.0MM
pins: 1, 2

## CL31B223KDCNNNC
designator C?, comment 0.022uF
CAP CER 0.022UF 200V X7R 1206; Part Number: CL31B223KDCNNNC; Manufacturer: Samsung Electro-Mechanics America, Inc.; TemperatureRange: -55C ~ 125C; Tolerance: 10%; Value: 0.022uF; PartId: 15467; Supplier 1: Digi-Key; Supplier Part Number 1: 1276-2765-2-ND; ComponentLink1Description: Datasheet; ComponentLink1URL: //media.digikey.com/pdf/Data%20Sheets/Samsung%20PDFs/CL31B223KDCNNNC_Spec.pdf; ComponentLink2Description: Digi-Key Listing; ComponentLink2URL: https://www.digikey.com/product-detail/en/samsung-electro-mechanics-america-inc/CL31B223KDCNNNC/1276-2765-2-ND/3888423; TemperatureCoefficient: X7R; Voltage: 200V; Price: 0.0755; Device Package: 1206 (3216 Metric)
footprint CAP 1206/3216
pins: 1, 2

## CL31B223KGHNNNE
designator C?, comment 0.022uF
CAP CER 0.022UF 500V X7R 1206; Part Number: CL31B223KGHNNNE; Manufacturer: Samsung Electro-Mechanics America, Inc.; TemperatureRange: -55C ~ 125C; Tolerance: 10%; Value: 0.022uF; PartId: 15445; Supplier 1: Digi-Key; Supplier Part Number 1: 1276-3124-2-ND; ComponentLink1Description: Datasheet; ComponentLink1URL: //media.digikey.com/pdf/Data%20Sheets/Samsung%20PDFs/CL31B223KGHNNNE_Spec.pdf; ComponentLink2Description: Digi-Key Listing; ComponentLink2URL: https://www.digikey.com/product-detail/en/samsung-electro-mechanics-america-inc/CL31B223KGHNNNE/1276-3124-2-ND/3888782; TemperatureCoefficient: X7R; Voltage: 500V; Price: 0.054; Device Package: 1206 (3216 Metric)
footprint CAP 1206/3216
pins: 1, 2

## CL31B223KHHNFNE
designator C?, comment 0.022uF
CAP CER 0.022UF 630V X7R 1206; Part Number: CL31B223KHHNFNE; Manufacturer: Samsung Electro-Mechanics America, Inc.; TemperatureRange: -55C ~ 125C; Tolerance: 10%; Value: 0.022uF; PartId: 15512; Supplier 1: Digi-Key; Supplier Part Number 1: 1276-3125-2-ND; ComponentLink1Description: Datasheet; ComponentLink1URL: //media.digikey.com/pdf/Data%20Sheets/Samsung%20PDFs/CL31B223KHHNFNE_Spec.pdf; ComponentLink2Description: Digi-Key Listing; ComponentLink2URL: https://www.digikey.com/product-detail/en/samsung-electro-mechanics-america-inc/CL31B223KHHNFNE/1276-3125-2-ND/3888783; TemperatureCoefficient: X7R; Voltage: 630V; Price: 0.054; Device Package: 1206 (3216 Metric)
footprint CAP 1206/3216
pins: 1, 2

## CL31B223KHHNNNE
designator C?, comment 0.022uF
CAP CER 0.022UF 630V X7R 1206; Part Number: CL31B223KHHNNNE; Manufacturer: Samsung Electro-Mechanics America, Inc.; TemperatureRange: -55C ~ 125C; Tolerance: 10%; Value: 0.022uF; PartId: 15443; Supplier 1: Digi-Key; Supplier Part Number 1: 1276-3126-2-ND; ComponentLink1Description: Datasheet; ComponentLink1URL: http://www.samsungsem.com/kr/support/product-search/mlcc/CL31B223KHHNNNE.jsp; ComponentLink2Description: Digi-Key Listing; ComponentLink2URL: https://www.digikey.com/product-detail/en/samsung-electro-mechanics-america-inc/CL31B223KHHNNNE/1276-3126-2-ND/3888784; TemperatureCoefficient: X7R; Voltage: 630V; Price: 0.054; Device Package: 1206 (3216 Metric)
footprint CAP 1206/3216
pins: 1, 2

## CL31B224KACNNNC
designator C?, comment 0.22uF
CAP CER 0.22UF 25V X7R 1206; Part Number: CL31B224KACNNNC; Manufacturer: Samsung Electro-Mechanics America, Inc.; TemperatureRange: -55C ~ 125C; Tolerance: 10%; Value: 0.22uF; PartId: 17106; Supplier 1: Digi-Key; Supplier Part Number 1: 1276-1839-2-ND; ComponentLink1Description: Datasheet; ComponentLink1URL: http://www.samsungsem.com/kr/support/product-search/mlcc/__icsFiles/afieldfile/2016/08/18/S_CL31B224KACNNNC.pdf; ComponentLink2Description: Digi-Key Listing; ComponentLink2URL: https://www.digikey.com/product-detail/en/samsung-electro-mechanics-america-inc/CL31B224KACNNNC/1276-1839-2-ND/3887497; TemperatureCoefficient: X7R; Voltage: 25V; Price: 0.0382; Device Package: 1206 (3216 Metric)
footprint CAP 1206/3216 - 1.0MM
pins: 1, 2

## CL31B224KBPWPNE
designator C?, comment 0.22uF
CAP CER 0.22UF 50V X7R 1206; Part Number: CL31B224KBPWPNE; Manufacturer: Samsung Electro-Mechanics America, Inc.; TemperatureRange: -55C ~ 125C; Tolerance: 10%; Value: 0.22uF; PartId: 17760; Supplier 1: Digi-Key; Supplier Part Number 1: 1276-6677-2-ND; ComponentLink1Description: Datasheet; ComponentLink1URL: //media.digikey.com/pdf/Data%20Sheets/Samsung%20PDFs/MLCC_Catalog_2015.pdf; ComponentLink2Description: Digi-Key Listing; ComponentLink2URL: https://www.digikey.com/product-detail/en/samsung-electro-mechanics-america-inc/CL31B224KBPWPNE/1276-6677-2-ND/5961161; TemperatureCoefficient: X7R; Voltage: 50V; Price: 0.0662; Device Package: 1206 (3216 Metric)
footprint CAP 1206/3216 - 1.8MM
pins: 1, 2

## CL31B224KCHNNNE
designator C?, comment 0.22uF
CAP CER 0.22UF 100V X7R 1206; Part Number: CL31B224KCHNNNE; Manufacturer: Samsung Electro-Mechanics America, Inc.; TemperatureRange: -55C ~ 125C; Tolerance: 10%; Value: 0.22uF; PartId: 17948; Supplier 1: Digi-Key; Supplier Part Number 1: 1276-3132-2-ND; ComponentLink1Description: Datasheet; ComponentLink1URL: //media.digikey.com/pdf/Data%20Sheets/Samsung%20PDFs/CL31B224KCHNNNE_Spec.pdf; ComponentLink2Description: Digi-Key Listing; ComponentLink2URL: https://www.digikey.com/product-detail/en/samsung-electro-mechanics-america-inc/CL31B224KCHNNNE/1276-3132-2-ND/3888790; TemperatureCoefficient: X7R; Voltage: 100V; Price: 0.1255; Device Package: 1206 (3216 Metric)
footprint CAP 1206/3216 - 1.8MM
pins: 1, 2

## CL31B224KCPWPNE
designator C?, comment 0.22uF
CAP CER 0.22UF 100V X7R 1206; Part Number: CL31B224KCPWPNE; Manufacturer: Samsung Electro-Mechanics America, Inc.; TemperatureRange: -55C ~ 125C; Tolerance: 10%; Value: 0.22uF; PartId: 17758; Supplier 1: Digi-Key; Supplier Part Number 1: 1276-6696-2-ND; ComponentLink1Description: Datasheet; ComponentLink1URL: //media.digikey.com/pdf/Data%20Sheets/Samsung%20PDFs/MLCC_Catalog_2015.pdf; ComponentLink2Description: Digi-Key Listing; ComponentLink2URL: https://www.digikey.com/product-detail/en/samsung-electro-mechanics-america-inc/CL31B224KCPWPNE/1276-6696-2-ND/5961180; TemperatureCoefficient: X7R; Voltage: 100V; Price: 0.0819; Device Package: 1206 (3216 Metric)
footprint CAP 1206/3216 - 1.8MM
pins: 1, 2

## CL31B225KAH4PNE
designator C?, comment 2.2uF
CAP CER 2.2UF 25V X7R 1206; Part Number: CL31B225KAH4PNE; Manufacturer: Samsung Electro-Mechanics America, Inc.; TemperatureRange: -55C ~ 125C; Tolerance: 10%; Type: Open Mode, Soft Termination; Value: 2.2uF; PartId: 6221; Supplier 1: Digi-Key; Supplier Part Number 1: 1276-3133-2-ND; ComponentLink1Description: Datasheet; ComponentLink1URL: http://media.digikey.com/pdf/Data%20Sheets/Samsung%20PDFs/CL31B225KAH4PNE_Spec.pdf; ComponentLink2Description: Digi-Key listing; ComponentLink2URL: http://digikey.com/product-detail/en/CL31B225KAH4PNE/1276-3133-2-ND/3888791; TemperatureCoefficient: X7R; Voltage: 25V; Price: 0.1712; Device Package: 1206 (3216 Metric)
footprint CAP 1206/3216
pins: 1, 2

## CL31B225KAHNFNE
designator C?, comment 2.2uF